# Altium footprint library Capacitor.PcbLib: 47 footprints (part 2 of 3)
Each footprint in its own frame and in the unit in brackets; x right, y up, seen from the top. Pads: shape width x height; smd on the part's side, far side on the other; paste and mask are expansions set on the pad; w line width, h text height; cw(c..) or ccw(c..) is an arc to the next point about the centre after c.
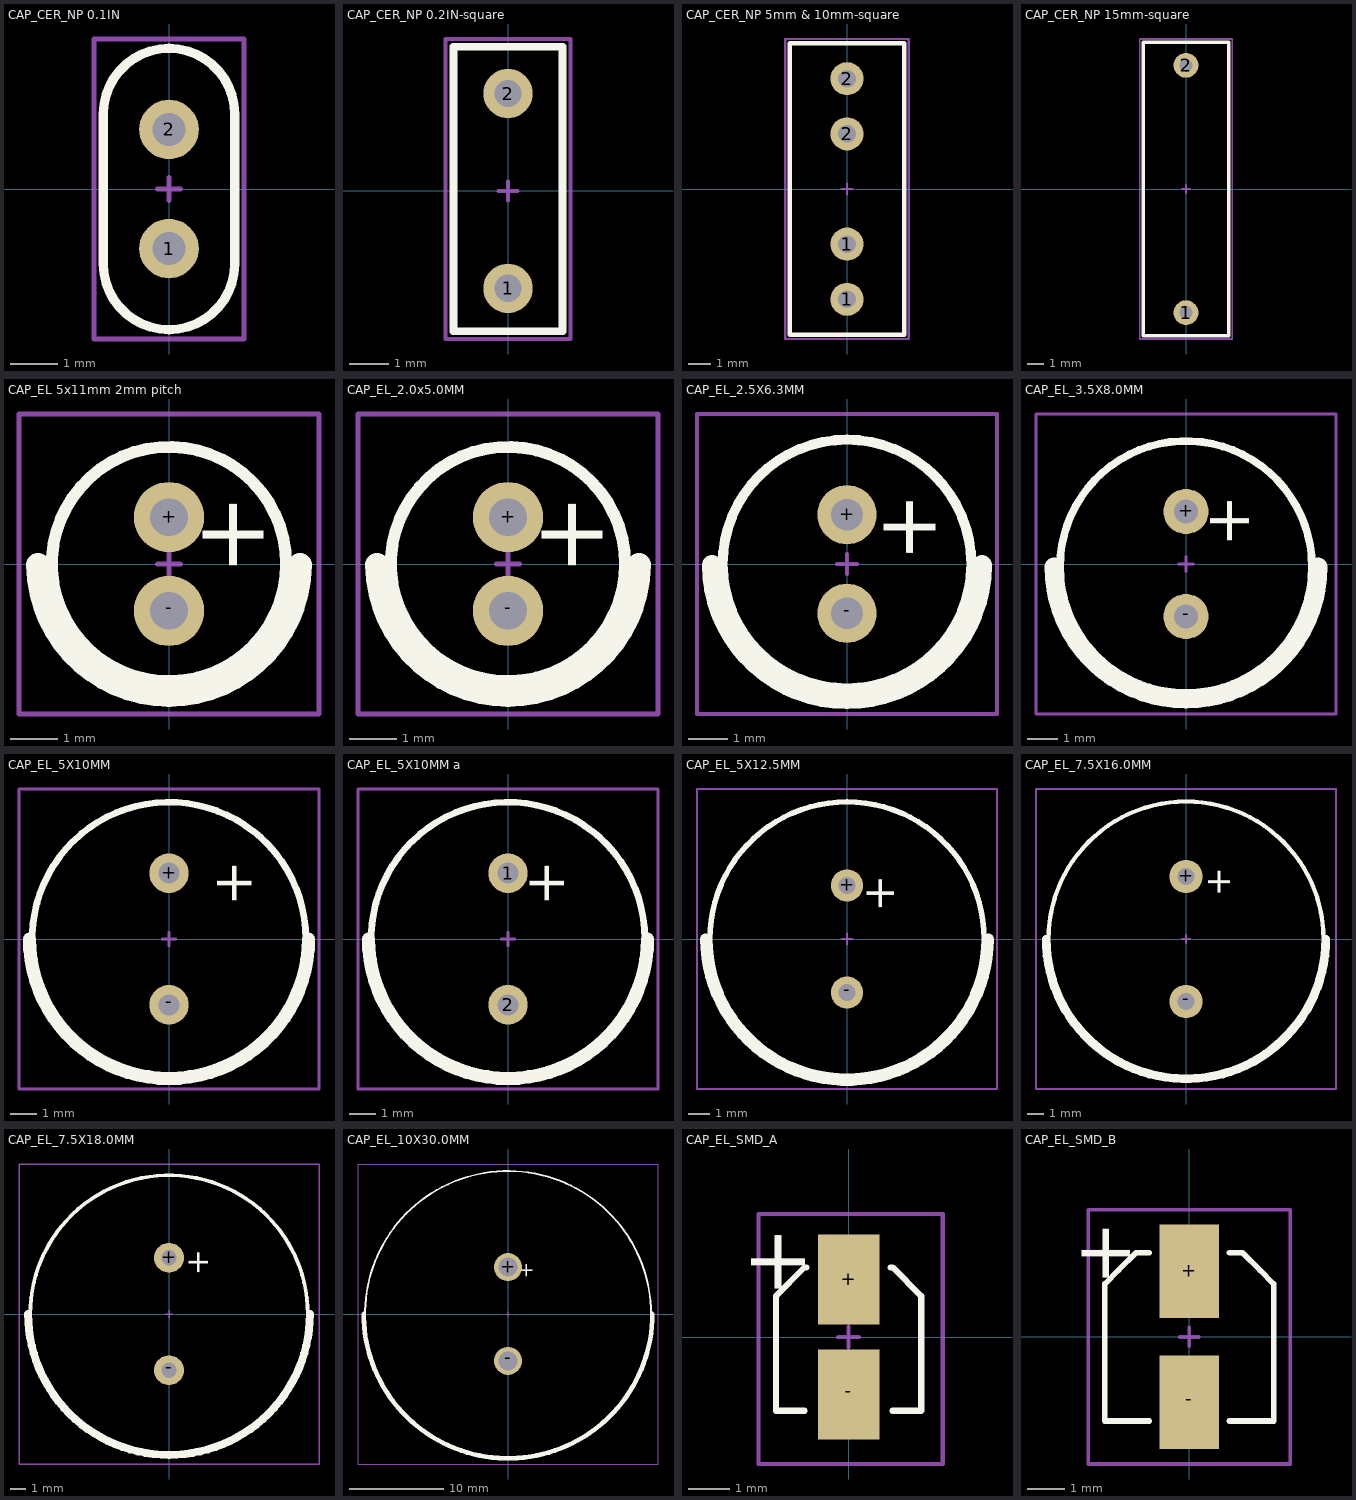
[diagram p1: the footprints below, top view; thin cyan lines are the x and y axes]

## CAP_CER_NP 0.1IN [mm] "Capacitor PTH"
pads (2):
  round 1.27 hole 0.7 mask+0.127: 1(0,-1.27) 2(0,1.27)
Top Overlay:
  lines w0.2: -1.4,-1.6 ccw(c0,-1.6) 1.4,-1.6 1.4,1.6 ccw(c0,1.6) -1.4,1.6 -1.4,-1.6
Mechanical 15:
  lines w0.1: -0.25,0 0.25,0 ; 0,-0.25 0,0.25 ; -1.6,-3.2 1.6,-3.2 1.6,3.2 -1.6,3.2 -1.6,-3.2
3D body "User Library-Capacitor ceramico 0_2in pitch.step": height 5.5, standoff -3.33, extent -1.25,-2.75 1.25,2.751

## CAP_CER_NP 0.2IN-square [mm] "Capacitor PTH"
pads (2):
  round 1.27 hole 0.7 mask+0.127: 1(0,-2.5) 2(0,2.5)
Top Overlay:
  lines w0.2: -1.4,-3.6 -1.4,3.7 1.4,3.7 1.4,-3.6 -1.4,-3.6
Mechanical 15:
  lines w0.1: -0.25,0 0.25,0 ; 0,-0.25 0,0.25 ; -1.6,-3.8 1.6,-3.8 1.6,3.9 -1.6,3.9 -1.6,-3.8
3D body "User Library-MKT_B32529.SLDPRT": height 6.5, standoff -6, extent -1.5,-3.65 1.5,3.65

## CAP_CER_NP 5mm & 10mm-square [mm] "Capacitor PTH"
pads (4):
  round 1.5 hole 0.8 mask+0.127: 1(0,-5) 2(0,5)
  round 1.5 hole 0.8: 1(0,-2.5) 2(0,2.5)
Top Overlay:
  lines w0.2: -2.6,-6.6 -2.6,6.6 2.6,6.6 2.6,-6.6 -2.6,-6.6
Mechanical 15:
  lines w0.1: -0.25,0 0.25,0 ; 0,-0.25 0,0.25 ; -2.8,-6.8 2.8,-6.8 2.8,6.8 -2.8,6.8 -2.8,-6.8
3D body "User Library-Hua Jung MKP-104K0305AB1101-P.STEP": height 12.1, standoff -2.71, extent -2.501,-6.5 2.5,6.5

## CAP_CER_NP 15mm-square [mm] "Capacitor PTH"
pads (2):
  round 1.5 hole 0.8 mask+0.127: 1(0,-7.5) 2(0,7.5)
Top Overlay:
  lines w0.2: -2.6,-8.9 2.6,-8.9 2.6,8.9 -2.6,8.9 -2.6,-8.9
Mechanical 15:
  lines w0.1: -0.25,0 0.25,0 ; 0,-0.25 0,0.25 ; -2.8,-9.1 -2.8,9.1 2.8,9.1 2.8,-9.1 -2.8,-9.1
3D body "Cap 15mm pitch.STEP": height 11.6, standoff -4.4, extent -2.5,-8.75 2.5,8.75

## CAP_EL 5x11mm 2mm pitch [mm] "Capacitor Eletrolítico PTH"
height 11
pads (2):
  round 1.5 hole 0.8 mask+0.127: +(0,1) -(0,-1)
Top Overlay:
  circle w0.254: c0,0 r2.5
  lines w0.508: -2.792,-0.022 ccw(c0,0) 2.792,-0.023
  text "+" at 0.725,1.5 h1.52
Mechanical 15:
  lines w0.1: -0.25,0 0.25,0 ; 0,-0.25 0,0.25 ; -3.2,-3.2 -3.2,3.2 3.2,3.2 3.2,-3.2 -3.2,-3.2
3D body "Electrolytic Radial Capacitor 5x11mm.STEP": height 11, standoff -19, extent -2.489,-2.5 2.511,2.5

## CAP_EL_2.0x5.0MM [mm] "Capacitor Eletrolítico PTH"
height 12
pads (2):
  round 1.5 hole 0.8 mask+0.127: +(0,1) -(0,-1)
Top Overlay:
  circle w0.254: c0,0 r2.5
  lines w0.508: -2.792,-0.022 ccw(c0,0) 2.792,-0.023
  text "+" at 0.725,1.5 h1.52
Mechanical 15:
  lines w0.1: -0.25,0 0.25,0 ; 0,-0.25 0,0.25 ; -3.2,-3.2 3.2,-3.2 3.2,3.2 -3.2,3.2 -3.2,-3.2
3D body "Cap electro 5x11x2mm.step": height 11.35, standoff -3.45, extent -2.525,-2.526 2.525,2.525

## CAP_EL_2.5X6.3MM [mm] "Capacitor Eletrolítico PTH"
pads (2):
  round 1.5 hole 0.8 mask+0.127: +(0,1.25) -(0,-1.25)
Top Overlay:
  circle w0.254: c0,0 r3.15
  lines w0.508: -3.425,-0.026 ccw(c0,0) 3.425,-0.032
  text "+" at 0.925,1.8 h1.52
Mechanical 15:
  lines w0.1: -0.25,0 0.25,0 ; 0,-0.25 0,0.25 ; -3.8,-3.8 3.8,-3.8 3.8,3.8 -3.8,3.8 -3.8,-3.8
3D body "Cap electro 6_3x11x2_5mm.step": height 11.53, standoff -3.01, extent -3.175,-3.176 3.176,3.175

## CAP_EL_3.5X8.0MM [mm] "Capacitor Eletrolítico PTH"
pads (2):
  round 1.5 hole 0.8: +(0,1.75) -(0,-1.75)
Top Overlay:
  circle w0.254: c0,-0.099 r4.2
  lines w0.635: -4.4,-0.099 ccw(c0,-0.099) 4.4,-0.099
  text "+" at 0.8,2.3 h1.52
Mechanical 15:
  lines w0.1: -0.25,0 0.25,0 ; 0,-0.25 0,0.25 ; -5,-5 5,-5 5,5 -5,5 -5,-5
3D body "60ROJ0517002 - 8x11_5x3_5mm.stp": height 11.83, standoff -3.68, extent -4.025,-4.023 4.026,4.028

## CAP_EL_5X10MM [mm] "Capacitor Eletrolítico PTH"
height 20
pads (2):
  round 1.5 hole 0.8 mask+0.127: +(0,2.5) -(0,-2.5)
Top Overlay:
  circle w0.254: c0,0 r5.2
  lines w0.508: -5.3,0 ccw(c0,0) 5.3,0
  text "+" at 1.825,3 h1.52
Mechanical 15:
  lines w0.1: -0.25,0 0.25,0 ; 0,-0.25 0,0.25 ; -5.7,-5.7 5.7,-5.7 5.7,5.7 -5.7,5.7 -5.7,-5.7
3D body "CAP_EL_10x20mm.STEP": height 19.99, standoff -3, extent -5,-4.996 5,5.004

## CAP_EL_5X10MM a [mm] "Capacitor Eletrolítico PTH"
height 20
pads (2):
  round 1.5 hole 0.8 mask+0.127: 1(0,2.5) 2(0,-2.5)
Top Overlay:
  circle w0.254: c0,0 r5.2
  lines w0.508: -5.3,0 ccw(c0,0) 5.3,0
  text "+" at 0.825,3 h1.52
Mechanical 15:
  lines w0.1: -0.25,0 0.25,0 ; 0,-0.25 0,0.25 ; -5.7,-5.7 5.7,-5.7 5.7,5.7 -5.7,5.7 -5.7,-5.7
3D body "CAP_EL_10x20mm.STEP": height 19.99, standoff -3, extent -5,-4.996 5,5.004

## CAP_EL_5X12.5MM [mm] "Capacitor Eletrolítico PTH"
height 20
pads (2):
  round 1.5 hole 0.8 mask+0.127: +(0,2.5) -(0,-2.5)
Top Overlay:
  circle w0.254: c0,0 r6.4
  lines w0.508: -6.6,0 ccw(c0,0) 6.6,0
  text "+" at 0.925,3 h1.52
Mechanical 15:
  lines w0.1: -0.25,0 0.25,0 ; 0,-0.25 0,0.25 ; -7,-7 7,-7 7,7 -7,7 -7,-7
3D body "CAP_EL_12.5x20mm.STEP": height 19.99, standoff -3, extent -6.226,-6.25 6.274,6.25

## CAP_EL_7.5X16.0MM [mm] "Capacitor Eletrolítico PTH"
height 25
pads (2):
  round 2 hole 1 mask+0.127: +(0,3.75) -(0,-3.75)
Top Overlay:
  circle w0.254: c0,0 r8.25
  lines w0.508: -8.4,0 ccw(c0,0) 8.4,0
  text "+" at 1.325,4.3 h1.52
Mechanical 15:
  lines w0.1: -0.25,0 0.25,0 ; 0,-0.25 0,0.25 ; -9,-9 9,-9 9,9 -9,9 -9,-9
3D body "User Library-Cap-EL(16x31_5-7_5)T.step": height 41.1, standoff -2.9, extent -8,-8 8,8.002

## CAP_EL_7.5X18.0MM [mm] "Capacitor Eletrolítico PTH"
height 32
pads (2):
  round 2 hole 1 mask+0.127: +(0,3.75) -(0,-3.75)
Top Overlay:
  circle w0.254: c0,0 r9.25
  lines w0.508: -9.4,0 ccw(c0,0) 9.4,0
  text "+" at 1.325,4.3 h1.52
Mechanical 15:
  lines w0.1: -0.25,0 0.25,0 ; 0,-0.25 0,0.25 ; -10,-10 -10,10 10,10 10,-10 -10,-10
3D body "Capacitor 18x33.5mm.STEP": height 33.51, standoff -6, extent -9,-9.005 9,9.005

## CAP_EL_10X30.0MM [mm] "Capacitor Eletrolítico PTH"
height 32
pads (2):
  round 3 hole 2 mask+0.127: +(0,5) -(0,-5)
Top Overlay:
  circle w0.2: c0,0 r15.25
  lines w0.5: -15.4,0 ccw(c0,0) 15.4,0
  text "+" at 1.3,5.5 h1.52
Mechanical 15:
  lines w0.1: -0.25,0 0.25,0 ; 0,-0.25 0,0.25 ; -16,-16 16,-16 16,16 -16,16 -16,-16
3D body "User Library-EL_D(30)P(10)H(45).step": height 45.01, standoff -5, extent -15,-15 15,15

## CAP_EL_SMD_A [mm] "Capacitor Eletrolítico SMD Case A"
pads (2):
  rect 1.5x2.2 smd: +(0,1.4) -(0,-1.4)
Top Overlay:
  lines w0.15: -1.075,-1.8 -1.775,-1.8 -1.775,1 -1.075,1.7 -1.025,1.7 ; 1.025,1.7 1.075,1.7 1.775,1 1.775,-1.8 1.075,-1.8
  text "+" at -2.375,2.7 h1.52
Mechanical 15:
  lines w0.1: -0.25,0 0.25,0 ; 0,-0.25 0,0.25 ; -2.2,-3.1 -2.2,3 2.3,3 2.3,-3.1 -2.2,-3.1
3D body "CAP_EL_SMD_A.STEP": height 5.4, standoff 0, extent -1.65,-1.8 1.65,1.8

## CAP_EL_SMD_B [mm] "Capacitor Eletrolítico SMD Case B"
pads (2):
  rect 1.6x2.5 smd: +(0,1.75) -(0,-1.75)
Top Overlay:
  lines w0.15: -1.075,-2.25 -2.258,-2.25 -2.258,1.417 -1.888,1.787 ; -1.075,2.25 -1.425,2.25 -1.888,1.787 ; 1.075,-2.25 2.258,-2.25 2.258,1.417 1.888,1.787 ; 1.075,2.25 1.425,2.25 1.888,1.787 ; -1.888,1.787 -1.888,1.787 ; 1.888,1.787 1.888,1.787
  text "+" at -2.875,3.1 h1.52
Mechanical 15:
  lines w0.1: -0.25,0 0.25,0 ; 0,-0.25 0,0.25 ; -2.7,-3.4 2.7,-3.4 2.7,3.4 -2.7,3.4 -2.7,-3.4
3D body "CAP_EL_SMD_B.STEP": height 5.4, standoff 0, extent -2.15,-2.3 2.15,2.3